# Altium footprint library miniFOC-foc_pcblib.PcbLib: 55 footprints (part 3 of 4)
Each footprint in its own frame and in the unit in brackets; x right, y up, seen from the top. Pads: shape width x height; smd on the part's side, far side on the other; paste and mask are expansions set on the pad; w line width, h text height; cw(c..) or ccw(c..) is an arc to the next point about the centre after c.
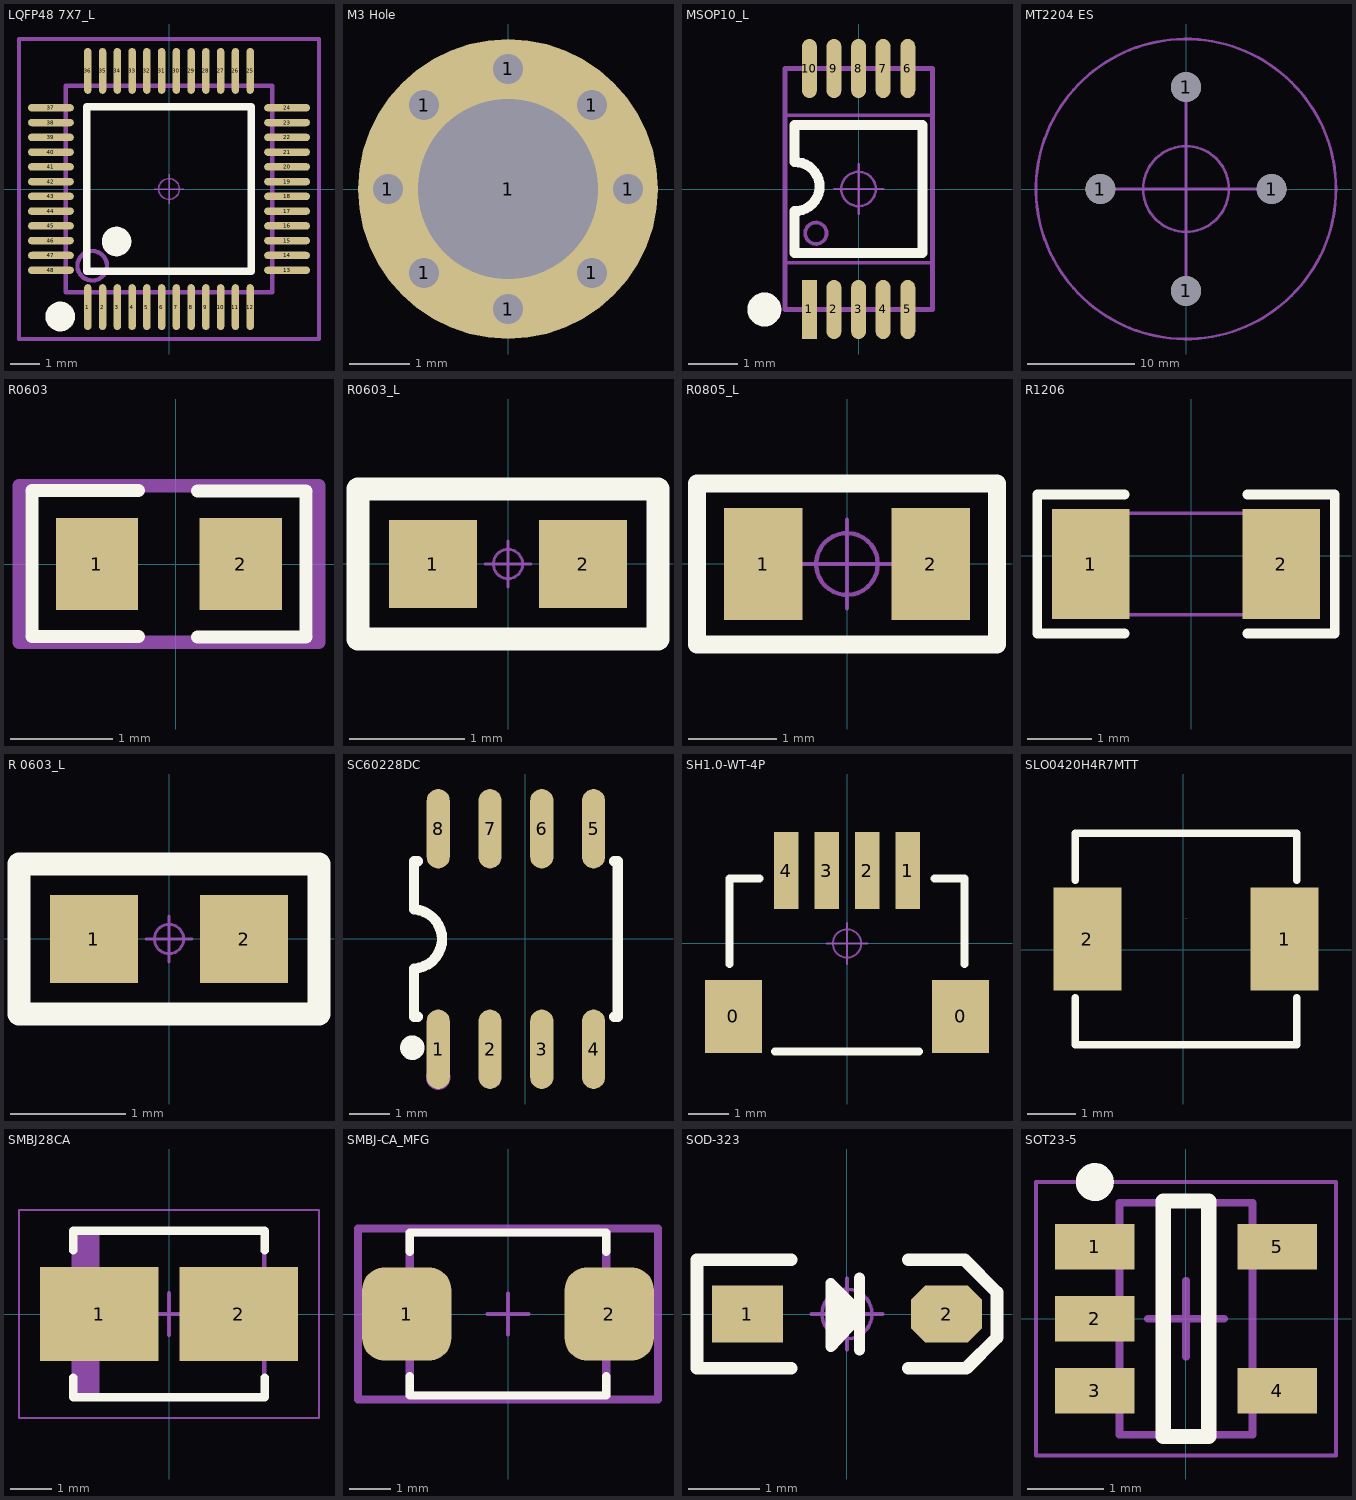
[diagram p2: the footprints below, top view; thin cyan lines are the x and y axes]

## LQFP48 7X7_L [mm] "48脚，体宽7x7mm，脚距0.5mm"
height 1.6
pads (48):
  oval 0.25x1.55 smd: 1(-2.75,-4) 2(-2.25,-4) 3(-1.75,-4) 4(-1.25,-4) 5(-0.75,-4) 6(-0.25,-4) 7(0.25,-4) 8(0.75,-4) 9(1.25,-4) 10(1.75,-4) 11(2.25,-4) 12(2.75,-4) 25(2.75,4) 26(2.25,4) 27(1.75,4) 28(1.25,4) 29(0.75,4) 30(0.25,4) 31(-0.25,4) 32(-0.75,4) 33(-1.25,4) 34(-1.75,4) 35(-2.25,4) 36(-2.75,4)
  oval 1.55x0.25 smd: 13(4,-2.75) 14(4,-2.25) 15(4,-1.75) 16(4,-1.25) 17(4,-0.75) 18(4,-0.25) 19(4,0.25) 20(4,0.75) 21(4,1.25) 22(4,1.75) 23(4,2.25) 24(4,2.75) 37(-4,2.75) 38(-4,2.25) 39(-4,1.75) 40(-4,1.25) 41(-4,0.75) 42(-4,0.25) 43(-4,-0.25) 44(-4,-0.75) 45(-4,-1.25) 46(-4,-1.75) 47(-4,-2.25) 48(-4,-2.75)
Top Overlay:
  circle w0.5: c-1.778,-1.778 r0.25
  circle w0.508: c-3.683,-4.318 r0.25
  lines w0.254: -2.794,-2.794 2.794,-2.794 2.794,2.794 -2.794,2.794 -2.794,-2.794
Mechanical 13:
  circle w0.15: c-2.6,-2.6 r0.5
  lines w0.15: -3.5,-3.5 3.5,-3.5 3.5,3.5 -3.5,3.5 -3.5,-3.5
Mechanical 15:
  circle w0.05: c0,0 r0.35
  lines w0.05: -0.5,0 0.5,0 ; 0,-0.5 0,0.5
  lines w0.15: -5.08,-5.08 5.08,-5.08 5.08,5.08 -5.08,5.08 -5.08,-5.08
3D body "LQFP48-7x7.STEP": height 1.45, standoff 0, extent -4.503,-4.503 4.503,4.503

## M3 Hole [mm]
pads (9):
  round 0.5 hole 0.5: 1(-2,0) 1(-1.4,-1.4) 1(-1.4,1.4) 1(0,-2) 1(0,2) 1(1.4,-1.4) 1(1.4,1.4) 1(2,0)
  round 5 hole 3: 1(0,0)

## MSOP10_L [mm] "塑封体长3mm，宽3mm，脚距0.5"
pads (10):
  rect 0.305x1.2 smd: 1(-1,-2.45)
  oval 0.305x1.2 smd: 2(-0.5,-2.45) 3(0,-2.45) 4(0.5,-2.45) 5(1,-2.45) 6(1,2.45) 7(0.5,2.45) 8(0,2.45) 9(-0.5,2.45) 10(-1,2.45)
Top Overlay:
  circle w0.381: c-1.917,-2.45 r0.155
  lines w0.2: -1.3,-1.3 1.3,-1.3 1.3,1.3 -1.3,1.3
  lines w0.203: -1.3,-1.3 -1.3,-0.46 ; -1.3,-0.45 ccw(c-1.3,0.058) -0.792,0.058 ; -1.3,0.55 cw(c-1.3,0.042) -0.792,0.042 ; -1.3,0.556 -1.3,1.3
Mechanical 13:
  circle w0.076: c-0.867,-0.9 r0.217
  lines w0.076: -1.5,-1.5 1.5,-1.5 1.5,1.5 -1.5,1.5 -1.5,-1.5
Mechanical 15:
  circle w0.05: c0,0 r0.35
  lines w0.05: -0.5,0 0.5,0 ; 0,-0.5 0,0.5
  lines w0.1: -1.5,-2.45 -1.5,2.45 1.5,2.45 1.5,-2.45 -1.5,-2.45
3D body "MSOP-10.STEP": height 0.95, standoff 0, extent -1.5,-2.45 1.5,2.45

## MT2204 ES [mm] "MT2204 encoder support"
pads (4):
  round 2.8 hole 2.8: 1(-8,0) 1(0,-9.5) 1(0,9.5) 1(8,0)
Mechanical 1:
  circle w0.254: c0,0 r14
Mechanical 15:
  circle w0.254: c0,0 r4
  lines w0.254: -8,0 8,0 ; 0,-9.5 0,9.5

## R0603 [mm]
pads (2):
  rect 0.8x0.9 smd: 1(-0.765,0) 2(0.635,0)
Top Overlay:
  lines w0.127: -0.361,-0.704 -1.397,-0.704 -1.397,0.715 -0.361,0.715 ; 0.215,-0.71 1.27,-0.71 1.27,0.71 0.215,0.71 ; 1.105,0.71 1.105,0.71
Mechanical 15:
  lines w0.003: -0.073,0.721 -0.072,0.722
  lines w0.127: -1.524,-0.762 -1.524,0.762 1.397,0.762 1.397,-0.762 -1.524,-0.762
3D body "Resistor 0603.step": height 0.5, standoff 0, extent -1.112,-0.416 0.988,0.384

## R0603_L [mil] "1/10W贴片电阻"
pads (2):
  rect 30x30 smd: 1(-25.59,0) 2(25.59,0)
Top Overlay:
  lines w8: -51.18,-25.59 51.18,-25.59 51.18,25.59 -51.18,25.59 -51.18,-25.59
Mechanical 15:
  circle w1: c0,0 r5
  lines w1: -7.87,0 7.87,0 ; 0,-7.87 0,7.87
3D body "R0603.STEP": height 15.79, standoff 0, extent -31.49,-15.75 31.5,15.75

## R0805_L [mil] "1/8W贴片电阻"
pads (2):
  rect 35x50 smd: 1(-37.4,0) 2(37.4,0)
Top Overlay:
  lines w8: -66.93,-36 -66.93,36 66.93,36 66.93,-36 -66.93,-36
Mechanical 15:
  circle w1.97: c0,0 r13.78
  lines w1.97: -19.68,0 19.68,0 ; 0,-19.68 0,19.68
3D body "R0805.STEP": height 19.72, standoff 0, extent -39.37,-24.6 39.37,24.61

## R1206 [mil]
pads (2):
  rect 47.54x66.97 smd mask+2: 1(-61.44,-5) 2(55,-5)
Top Overlay:
  lines w6: -40.67,-47.48 -94.21,-47.48 -94.21,37.48 -40.67,37.48 ; 34.23,-47.48 87.77,-47.48 87.77,37.48 34.23,37.48
Top Paste:
  region: -37.67,-34.55 -37.67,-20.32 -41.61,-16.39 -49.9,-16.39 -53.83,-12.45 -53.83,2.45 -49.9,6.38 -41.61,6.38 -37.67,10.32 -37.67,24.55 -41.61,28.48 -81.27,28.48 -85.21,24.55 -85.21,-34.55 -81.27,-38.48 -41.61,-38.48
  region: 31.23,-34.55 31.23,-20.32 35.17,-16.39 43.46,-16.39 47.39,-12.45 47.39,2.45 43.46,6.38 35.17,6.38 31.23,10.32 31.23,24.55 35.17,28.48 74.83,28.48 78.77,24.55 78.77,-34.55 74.83,-38.48 35.17,-38.48
Mechanical 15:
  region: 57.8,-36 57.8,26 40.09,26 40.09,-36
  region: -64.24,-36 -64.24,26 -46.53,26 -46.53,-36
  region: -61.88,-36 -61.88,-35.02 -63.26,-33.64 -65.22,-33.64 -66.6,-35.02 -66.6,-36 -66.6,-36.98 -65.22,-38.36 -63.26,-38.36 -61.88,-36.98
  lines w2: -64.24,-36 57.8,-36 57.8,26 -64.24,26 -64.24,-36
3D body "res_1206.stp": height 27.56, standoff 0, extent -67.99,-36.49 58,26.5

## R 0603_L [mil] "1/10W贴片电阻"
pads (2):
  rect 30x30 smd: 1(-25.59,0) 2(25.59,0)
Top Overlay:
  lines w8: -51.18,-25.59 51.18,-25.59 51.18,25.59 -51.18,25.59 -51.18,-25.59
Mechanical 15:
  circle w1: c0,0 r5
  lines w1: -7.87,0 7.87,0 ; 0,-7.87 0,7.87
3D body "R 0603.STEP": height 15.79, standoff -0.13, extent -31.5,-15.75 31.5,15.75

## SC60228DC [mm] "SOP-8, 12-Bit magnetically encoded angle sensor"
pads (8):
  oval 0.568x1.95 smd: 1(-2.136,-2.708) 2(-0.866,-2.708) 3(0.404,-2.708) 4(1.674,-2.708) 5(1.674,2.702) 6(0.404,2.702) 7(-0.866,2.702) 8(-2.136,2.702)
Top Overlay:
  circle w0.3: c-2.771,-2.67 r0.15
  lines w0.254: -2.731,0.723 -2.731,1.497 -2.731,1.902 -2.639,1.902 ; -2.726,0.723 cw(c-2.771,-0.003) -2.731,-0.729 -2.731,-1.503 -2.731,-1.908 -2.639,-1.908 ; 2.178,-1.908 2.269,-1.908 2.269,-1.503 2.269,1.497 2.269,1.902 2.178,1.902
Mechanical 15:
  circle w0.3: c-2.136,-3.403 r0.15
3D body "SOP-8.STEP": height 1.87, standoff 0, extent -2.754,-3.11 2.246,3.11

## SH1.0-WT-4P [mm] "SH1.0连接器-卧贴-4P          来自淘宝卖家ID：黄晶宝石"
pads (6):
  rect 1.4x1.8 smd: 0(-2.8,-1.8) 0(2.8,-1.8)
  rect 0.6x1.9 smd: 1(1.5,1.8) 2(0.5,1.8) 3(-0.5,1.8) 4(-1.5,1.8)
Top Overlay:
  lines w0.2: -2.9,-0.508 -2.9,1.6 -2.159,1.6 ; -1.778,-2.667 1.778,-2.667 ; 2.159,1.6 2.8,1.6 2.9,1.6 2.9,1.5 2.9,-0.508
Mechanical 15:
  circle w0.05: c0,0 r0.35
  lines w0.05: -0.5,0 0.5,0 ; 0,-0.5 0,0.5
3D body "SH1.0-WT-4P.STEP": height 2.9, standoff 0, extent -3,-2.6 3,2.35

## SLO0420H4R7MTT [mm] "SMD, 4.7uH ±20%, 100KHz/V, 2.2A, 3.0A"
pads (2):
  rect 1.4x2.12 smd: 1(2.089,0.22) 2(-1.967,0.22)
Top Overlay:
  lines w0.152: -2.215,-0.992 -2.215,-1.956 2.337,-1.956 2.337,-0.992 ; -2.215,1.433 -2.215,2.397 2.337,2.397 2.337,1.433
Mechanical 15:
  lines w0.003: 0.061,0.65 0.061,0.65
3D body "LPS4018.stp": height 1.8, standoff 0, extent -1.891,-1.749 2.059,2.201

## SMBJ28CA [mm] "Molded Diode, 2-Leads, Body 4.31x3.62mm, IPC Low Density"
height 2.5
pads (2):
  rect 2.85x2.25 smd: 1(-1.675,0) 2(1.675,0)
Top Overlay:
  lines w0.2: -2.3,-1.525 -2.3,-2 2.3,-2 2.3,-1.525 ; -2.3,1.525 -2.3,2 2.3,2 2.3,1.525
Mechanical 13:
  rectangle: -2.285,-1.97 -1.67,1.97
  lines w0.1: -2.285,-1.97 2.285,-1.97 2.285,1.97 -2.285,1.97 -2.285,-1.97
Mechanical 15:
  lines w0.05: -3.6,-2.5 3.6,-2.5 3.6,2.5 -3.6,2.5 -3.6,-2.5
  lines w0.1: -0.5,0 0.5,0 ; 0,-0.5 0,0.5
3D body "SMJ28CA.step": height 2.5, standoff 0, extent -2.505,-1.97 2.505,1.97

## SMBJ-CA_MFG [mm]
height 4.3
pads (2):
  rrect50% 2.16x2.26 smd paste+0 mask+0: 1(-2.45,0) 2(2.45,0)
Top Overlay:
  lines w0.2: -2.375,-1.505 -2.375,-1.97 2.375,-1.97 2.375,-1.505 ; -2.375,1.505 -2.375,1.97 2.375,1.97 2.375,1.505
Mechanical 10:
  lines w0.2: -3.63,-2.07 -3.63,2.07 3.63,2.07 3.63,-2.07 -3.63,-2.07
Mechanical 12:
  lines w0.2: -2.375,-1.97 -2.375,1.97 2.375,1.97 2.375,-1.97 -2.375,-1.97
Mechanical 15:
  lines w0.1: -0.5,0 0.5,0 ; 0,-0.5 0,0.5
  lines w0.2: -3.63,-2.07 -3.63,2.07 3.63,2.07 3.63,-2.07 -3.63,-2.07
3D body "Diode_Littelfuse_Inc_SMBJ28CA_eec.STEP": height 2.62, standoff 0, extent -2.7,-1.81 2.7,1.81

## SOD-323 [mm] "1.8x1.3X0.9mm（长宽高，不包括引脚）"
pads (2):
  rect 1x0.8 smd: 1(-1.4,0)
  oct 1x0.8 smd: 2(1.4,0)
Top Overlay:
  lines w0.152: 0.178,-0.508 0.178,0.508 ; 0.178,-0.025 -0.229,-0.457 -0.229,0.432 0.178,0.025
  lines w0.178: -0.787,-0.762 -2.108,-0.762 -2.108,0.762 -0.787,0.762 ; 0.864,-0.762 1.676,-0.762 2.108,-0.33 2.108,0.305 1.651,0.762 0.864,0.762
  lines w0.254: -0.127,0.254 -0.152,-0.178 0.025,-0.025 -0.025,0.127
Mechanical 15:
  circle w0.05: c0,0 r0.35
  lines w0.05: -0.5,0 0.5,0 ; 0,-0.5 0,0.5
3D body "SOD-323.STEP": height 0.95, standoff 0, extent -1.324,-0.65 1.324,0.65

## SOT23-5 [mm] "SOT23, 5-Leads, Body 2.9x1.6mm, Pitch 0.95mm, IPC Medium Density                联系卖家 免费查找封装"
height 1.1
pads (5):
  rect 1.05x0.6 smd: 1(-1.2,0.95) 2(-1.2,0) 3(-1.2,-0.95) 4(1.2,-0.95) 5(1.2,0.95)
Top Overlay:
  circle w0.25: c-1.2,1.8 r0.125
  lines w0.2: -0.3,-1.55 0.3,-1.55 0.3,1.55 -0.3,1.55 -0.3,-1.55
Mechanical 13:
  lines w0.1: -0.875,-1.525 0.875,-1.525 0.875,1.525 -0.875,1.525 -0.875,-1.525
Mechanical 15:
  lines w0.05: -1.975,-1.8 -1.975,1.8 1.975,1.8 1.975,-1.8 -1.975,-1.8
  lines w0.1: -0.5,0 0.5,0 ; 0,-0.5 0,0.5
3D body "SOT23-5-2.STEP": height 1.15, standoff -0.03, extent -1.403,-1.5 1.403,1.5